# Altium integrated library LEMO Unipole And Multipole Type Connectors.IntLib: 1566 symbols (part 6 of 13)
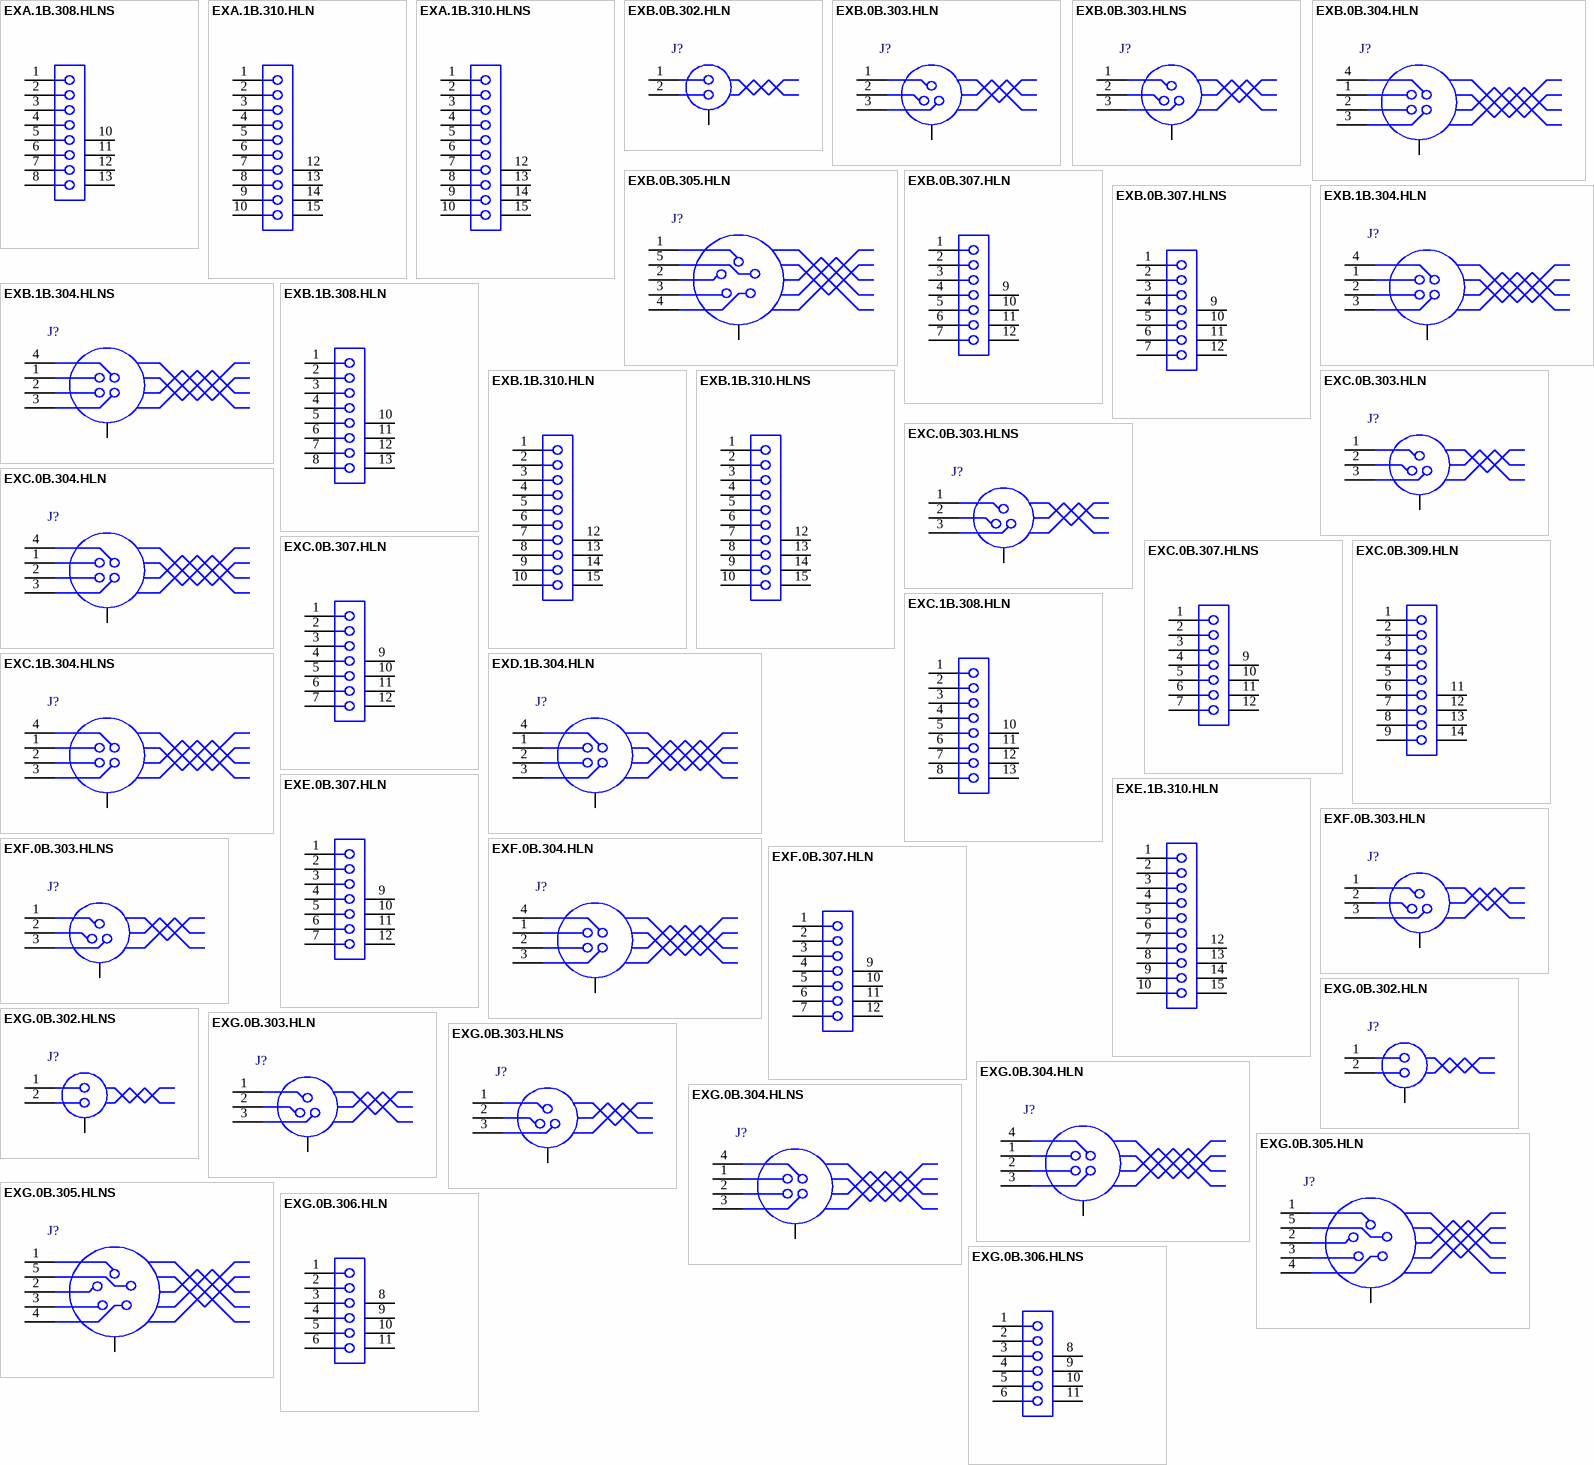
[diagram p48: symbols EXA.1B.308.HLNS to EXG.0B.306.HLNS]

## EXG.0B.304.HLN
designator J?
Elbow receptacle for printed circuit with two nuts (solder or screw fixing, back panel mounting), Key (G), 0B series, Multipole Type with 4 Contacts; Manufacturer: LEMO; PartNumber: EXG.0B.304.HLN; Number of contacts: 4; Contact Diameter: 0.7 mm; AWG: 24; Rated Current(A): 6; DatasheetVersion: Jun-14; PackageReference: EXG.0B.304.HLN; PackageDescription: Elbow receptacle for printed circuit with two nuts (solder or screw fixing, back panel mounting), Key(G) for Printed Circuit; Supplier 1: Mouser; Supplier Part Number 1: 736-EXG0B304HLN; Supplier 2: Newark; Supplier Part Number 2: 64R6458; Supplier 3: Digi-Key; Supplier Part Number 3: 1124-1428-ND; ComponentLink1Description: Manufacturer URL; ComponentLink1URL: http://www.lemo.com; ComponentLink2Description: Datasheet; ComponentLink2URL: http://intra.lemo.ch/catalog/ROW/UK_English/unipole_multipole.pdf
footprint EXG.0B.304.HLN (Socket, Female, Body 9mm dia. Height 10.5 mm, Through hole)
pins: 1, 2, 3, 4, 6, 7, 8, 9

## EXG.0B.304.HLNS
designator J?
Elbow receptacle for printed circuit with two nuts (solder or screw fixing, back panel mounting), Key (G), 0B series, Multipole Type with 4 Contacts; Manufacturer: LEMO; PartNumber: EXG.0B.304.HLNS; Number of contacts: 4; Contact Diameter: 0.7 mm; AWG: 24; Rated Current(A): 6; DatasheetVersion: Jun-14; PackageReference: EXG.0B.304.HLNS; PackageDescription: Elbow receptacle for printed circuit with two nuts (solder or screw fixing, back panel mounting), Key(G) for Printed Circuit; ComponentLink1Description: Manufacturer URL; ComponentLink1URL: http://www.lemo.com; ComponentLink2Description: Datasheet; ComponentLink2URL: http://intra.lemo.ch/catalog/ROW/UK_English/unipole_multipole.pdf
footprint EXG.0B.304.HLNS (Socket, Female, Body 9mm dia. Height 10.5 mm, Through hole)
pins: 1, 2, 3, 4, 6, 7, 8, 9

## EXG.0B.305.HLN
designator J?
Elbow receptacle for printed circuit with two nuts (solder or screw fixing, back panel mounting), Key (G), 0B series, Multipole Type with 5 Contacts; Manufacturer: LEMO; PartNumber: EXG.0B.305.HLN; Number of contacts: 5; Contact Diameter: 0.7 mm; AWG: 24; Rated Current(A): 6; DatasheetVersion: Jun-14; PackageReference: EXG.0B.305.HLN; PackageDescription: Elbow receptacle for printed circuit with two nuts (solder or screw fixing, back panel mounting), Key(G) for Printed Circuit; Supplier 1: Mouser; Supplier Part Number 1: 736-EXG0B305HLN; Supplier 2: Digi-Key; Supplier Part Number 2: EXG.0B.305.HLN-ND; ComponentLink1Description: Manufacturer URL; ComponentLink1URL: http://www.lemo.com; ComponentLink2Description: Datasheet; ComponentLink2URL: http://intra.lemo.ch/catalog/ROW/UK_English/unipole_multipole.pdf
footprint EXG.0B.305.HLN (Socket, Female, Body 9mm dia. Height 10.5 mm, Through hole)
pins: 1, 2, 3, 4, 5, 7, 8, 9, 10

## EXG.0B.305.HLNS
designator J?
Elbow receptacle for printed circuit with two nuts (solder or screw fixing, back panel mounting), Key (G), 0B series, Multipole Type with 5 Contacts; Manufacturer: LEMO; PartNumber: EXG.0B.305.HLNS; Number of contacts: 5; Contact Diameter: 0.7 mm; AWG: 24; Rated Current(A): 6; DatasheetVersion: Jun-14; PackageReference: EXG.0B.305.HLNS; PackageDescription: Elbow receptacle for printed circuit with two nuts (solder or screw fixing, back panel mounting), Key(G) for Printed Circuit; Supplier 1: Mouser; Supplier Part Number 1: 736-EXG0B305HLNS; Supplier 2: Digi-Key; Supplier Part Number 2: EXG.0B.305.HLNS-ND; ComponentLink1Description: Manufacturer URL; ComponentLink1URL: http://www.lemo.com; ComponentLink2Description: Datasheet; ComponentLink2URL: http://intra.lemo.ch/catalog/ROW/UK_English/unipole_multipole.pdf
footprint EXG.0B.305.HLNS (Socket, Female, Body 9mm dia. Height 10.5 mm, Through hole)
pins: 1, 2, 3, 4, 5, 7, 8, 9, 10

## EXG.0B.306.HLN
designator J?
Elbow receptacle for printed circuit with two nuts (solder or screw fixing, back panel mounting), Key (G), 0B series, Multipole Type with 6 Contacts; Manufacturer: LEMO; PartNumber: EXG.0B.306.HLN; Number of contacts: 6; Contact Diameter: 0.5 mm; AWG: 28; Rated Current(A): 2.5.; DatasheetVersion: Jun-14; PackageReference: EXG.0B.306.HLN; PackageDescription: Elbow receptacle for printed circuit with two nuts (solder or screw fixing, back panel mounting), Key(G) for Printed Circuit; Supplier 1: Mouser; Supplier Part Number 1: 736-EXG0B306HLN; Supplier 2: Newark; Supplier Part Number 2: 56W4223; Supplier 3: Digi-Key; Supplier Part Number 3: EXG.0B.306.HLN-ND; ComponentLink1Description: Manufacturer URL; ComponentLink1URL: http://www.lemo.com; ComponentLink2Description: Datasheet; ComponentLink2URL: http://intra.lemo.ch/catalog/ROW/UK_English/unipole_multipole.pdf
footprint EXG.0B.306.HLN (Socket, Female, Body 9mm dia. Height 10.5 mm, Through hole)
pins: 1, 2, 3, 4, 5, 6, 8, 9, 10, 11

## EXG.0B.306.HLNS
designator J?
Elbow receptacle for printed circuit with two nuts (solder or screw fixing, back panel mounting), Key (G), 0B series, Multipole Type with 6 Contacts; Manufacturer: LEMO; PartNumber: EXG.0B.306.HLNS; Number of contacts: 6; Contact Diameter: 0.5 mm; AWG: 28; Rated Current(A): 2.5.; DatasheetVersion: Jun-14; PackageReference: EXG.0B.306.HLNS; PackageDescription: Elbow receptacle for printed circuit with two nuts (solder or screw fixing, back panel mounting), Key(G) for Printed Circuit; ComponentLink1Description: Manufacturer URL; ComponentLink1URL: http://www.lemo.com; ComponentLink2Description: Datasheet; ComponentLink2URL: http://intra.lemo.ch/catalog/ROW/UK_English/unipole_multipole.pdf
footprint EXG.0B.306.HLNS (Socket, Female, Body 9mm dia. Height 10.5 mm, Through hole)
pins: 1, 2, 3, 4, 5, 6, 8, 9, 10, 11

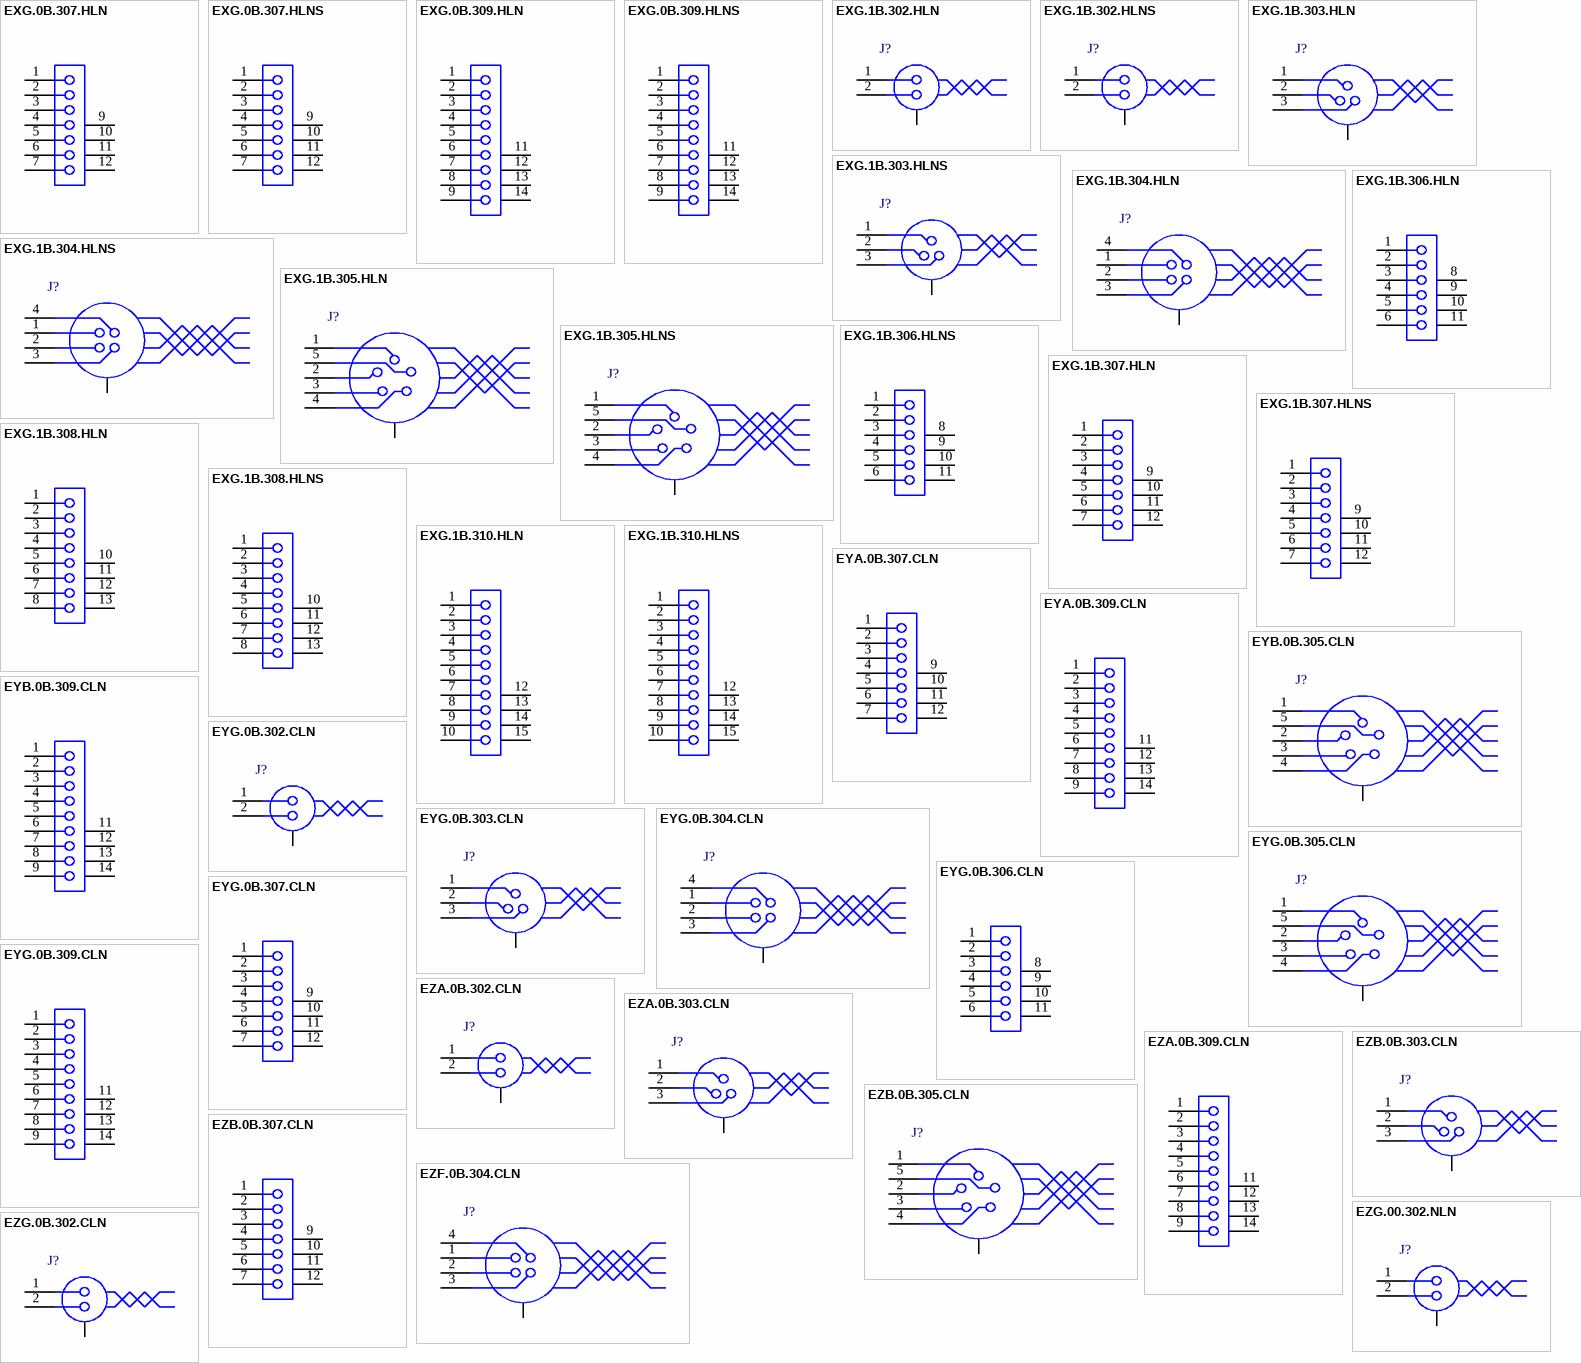
[diagram p17: symbols EXG.0B.307.HLN to EZG.0B.302.CLN]

## EXG.0B.307.HLN
designator J?
Elbow receptacle for printed circuit with two nuts (solder or screw fixing, back panel mounting), Key (G), 0B series, Multipole Type with 7 Contacts; Manufacturer: LEMO; PartNumber: EXG.0B.307.HLN; Number of contacts: 7; Contact Diameter: 0.5 mm; AWG: 28; Rated Current(A): 2; DatasheetVersion: Jun-14; PackageReference: EXG.0B.307.HLN; PackageDescription: Elbow receptacle for printed circuit with two nuts (solder or screw fixing, back panel mounting), Key(G) for Printed Circuit; Supplier 1: Mouser; Supplier Part Number 1: 736-EXG0B307HLN; Supplier 2: Newark; Supplier Part Number 2: 56W4221; ComponentLink1Description: Manufacturer URL; ComponentLink1URL: http://www.lemo.com; ComponentLink2Description: Datasheet; ComponentLink2URL: http://intra.lemo.ch/catalog/ROW/UK_English/unipole_multipole.pdf
footprint EXG.0B.307.HLN (Socket, Female, Body 9mm dia. Height 10.5 mm, Through hole)
pins: 1, 2, 3, 4, 5, 6, 7, 9, 10, 11, 12

## EXG.0B.307.HLNS
designator J?
Elbow receptacle for printed circuit with two nuts (solder or screw fixing, back panel mounting), Key (G), 0B series, Multipole Type with 7 Contacts; Manufacturer: LEMO; PartNumber: EXG.0B.307.HLNS; Number of contacts: 7; Contact Diameter: 0.5 mm; AWG: 28; Rated Current(A): 2; DatasheetVersion: Jun-14; PackageReference: EXG.0B.307.HLNS; PackageDescription: Elbow receptacle for printed circuit with two nuts (solder or screw fixing, back panel mounting), Key(G) for Printed Circuit; Supplier 1: Mouser; Supplier Part Number 1: 736-EXG0B307HLNS; Supplier 2: Digi-Key; Supplier Part Number 2: EXG.0B.307.HLNS-ND; ComponentLink1Description: Manufacturer URL; ComponentLink1URL: http://www.lemo.com; ComponentLink2Description: Datasheet; ComponentLink2URL: http://intra.lemo.ch/catalog/ROW/UK_English/unipole_multipole.pdf
footprint EXG.0B.307.HLNS (Socket, Female, Body 9mm dia. Height 10.5 mm, Through hole)
pins: 1, 2, 3, 4, 5, 6, 7, 9, 10, 11, 12

## EXG.0B.309.HLN
designator J?
Elbow receptacle for printed circuit with two nuts (solder or screw fixing, back panel mounting), Key (G), 0B series, Multipole Type with 9 Contacts; Manufacturer: LEMO; PartNumber: EXG.0B.309.HLN; Number of contacts: 9; Contact Diameter: 0.5 mm; AWG: 28; Rated Current(A): 1.5.; DatasheetVersion: Jun-14; PackageReference: EXG.0B.309.HLN; PackageDescription: Elbow receptacle for printed circuit with two nuts (solder or screw fixing, back panel mounting), Key(G) for Printed Circuit; Supplier 1: Mouser; Supplier Part Number 1: 736-EXG0B309HLN; Supplier 2: Newark; Supplier Part Number 2: 56W4225; Supplier 3: Digi-Key; Supplier Part Number 3: EXG.0B.309.HLN-ND; ComponentLink1Description: Manufacturer URL; ComponentLink1URL: http://www.lemo.com; ComponentLink2Description: Datasheet; ComponentLink2URL: http://intra.lemo.ch/catalog/ROW/UK_English/unipole_multipole.pdf
footprint EXG.0B.309.HLN (Socket, Female, Body 9mm dia. Height 10.5 mm, Through hole)
pins: 1, 2, 3, 4, 5, 6, 7, 8, 9, 11, 12, 13, 14

## EXG.0B.309.HLNS
designator J?
Elbow receptacle for printed circuit with two nuts (solder or screw fixing, back panel mounting), Key (G), 0B series, Multipole Type with 9 Contacts; Manufacturer: LEMO; PartNumber: EXG.0B.309.HLNS; Number of contacts: 9; Contact Diameter: 0.5 mm; AWG: 28; Rated Current(A): 1.5.; DatasheetVersion: Jun-14; PackageReference: EXG.0B.309.HLNS; PackageDescription: Elbow receptacle for printed circuit with two nuts (solder or screw fixing, back panel mounting), Key(G) for Printed Circuit; Supplier 1: Mouser; Supplier Part Number 1: 736-EXG0B309HLNS; Supplier 2: Digi-Key; Supplier Part Number 2: EXG.0B.309.HLNS-ND; ComponentLink1Description: Manufacturer URL; ComponentLink1URL: http://www.lemo.com; ComponentLink2Description: Datasheet; ComponentLink2URL: http://intra.lemo.ch/catalog/ROW/UK_English/unipole_multipole.pdf
footprint EXG.0B.309.HLNS (Socket, Female, Body 9mm dia. Height 10.5 mm, Through hole)
pins: 1, 2, 3, 4, 5, 6, 7, 8, 9, 11, 12, 13, 14

## EXG.1B.302.HLN
designator J?
Elbow receptacle for printed circuit with two nuts (solder or screw fixing, back panel mounting), Key (G), 1B series, Multipole Type with 2 Contacts; Manufacturer: LEMO; PartNumber: EXG.1B.302.HLN; Number of contacts: 2; Contact Diameter: 1.3 mm; AWG: 20; Rated Current(A): 12; DatasheetVersion: Jun-14; PackageReference: EXG.1B.302.HLN; PackageDescription: Elbow receptacle for printed circuit with two nuts (solder or screw fixing, back panel mounting), Key(G) for Printed Circuit; Supplier 1: Mouser; Supplier Part Number 1: 736-EXG1B302HLN; Supplier 2: Digi-Key; Supplier Part Number 2: EXG.1B.302.HLN-ND; ComponentLink1Description: Manufacturer URL; ComponentLink1URL: http://www.lemo.com; ComponentLink2Description: Datasheet; ComponentLink2URL: http://intra.lemo.ch/catalog/ROW/UK_English/unipole_multipole.pdf
footprint EXG.1B.302.HLN (Socket, Female, Body 11mm dia. Height 14 mm, Through hole)
pins: 1, 2, 4, 5, 6, 7

## EXG.1B.302.HLNS
designator J?
Elbow receptacle for printed circuit with two nuts (solder or screw fixing, back panel mounting), Key (G), 1B series, Multipole Type with 2 Contacts; Manufacturer: LEMO; PartNumber: EXG.1B.302.HLNS; Number of contacts: 2; Contact Diameter: 1.3 mm; AWG: 20; Rated Current(A): 12; DatasheetVersion: Jun-14; PackageReference: EXG.1B.302.HLNS; PackageDescription: Elbow receptacle for printed circuit with two nuts (solder or screw fixing, back panel mounting), Key(G) for Printed Circuit; ComponentLink1Description: Manufacturer URL; ComponentLink1URL: http://www.lemo.com; ComponentLink2Description: Datasheet; ComponentLink2URL: http://intra.lemo.ch/catalog/ROW/UK_English/unipole_multipole.pdf
footprint EXG.1B.302.HLNS (Socket, Female, Body 11mm dia. Height 14 mm, Through hole)
pins: 1, 2, 4, 5, 6, 7

## EXG.1B.303.HLN
designator J?
Elbow receptacle for printed circuit with two nuts (solder or screw fixing, back panel mounting), Key (G), 1B series, Multipole Type with 3 Contacts; Manufacturer: LEMO; PartNumber: EXG.1B.303.HLN; Number of contacts: 3; Contact Diameter: 1.3 mm; AWG: 20; Rated Current(A): 4.5.; DatasheetVersion: Jun-14; PackageReference: EXG.1B.303.HLN; PackageDescription: Elbow receptacle for printed circuit with two nuts (solder or screw fixing, back panel mounting), Key(G) for Printed Circuit; Supplier 1: Mouser; Supplier Part Number 1: 736-EXG1B303HLN; Supplier 2: Digi-Key; Supplier Part Number 2: EXG.1B.303.HLN-ND; ComponentLink1Description: Manufacturer URL; ComponentLink1URL: http://www.lemo.com; ComponentLink2Description: Datasheet; ComponentLink2URL: http://intra.lemo.ch/catalog/ROW/UK_English/unipole_multipole.pdf
footprint EXG.1B.303.HLN (Socket, Female, Body 11mm dia. Height 14 mm, Through hole)
pins: 1, 2, 3, 5, 6, 7, 8

## EXG.1B.303.HLNS
designator J?
Elbow receptacle for printed circuit with two nuts (solder or screw fixing, back panel mounting), Key (G), 1B series, Multipole Type with 3 Contacts; Manufacturer: LEMO; PartNumber: EXG.1B.303.HLNS; Number of contacts: 3; Contact Diameter: 1.3 mm; AWG: 20; Rated Current(A): 4.5.; DatasheetVersion: Jun-14; PackageReference: EXG.1B.303.HLNS; PackageDescription: Elbow receptacle for printed circuit with two nuts (solder or screw fixing, back panel mounting), Key(G) for Printed Circuit; Supplier 1: Mouser; Supplier Part Number 1: 736-EXG1B303HLNS; Supplier 2: Digi-Key; Supplier Part Number 2: EXG.1B.303.HLNS-ND; ComponentLink1Description: Manufacturer URL; ComponentLink1URL: http://www.lemo.com; ComponentLink2Description: Datasheet; ComponentLink2URL: http://intra.lemo.ch/catalog/ROW/UK_English/unipole_multipole.pdf
footprint EXG.1B.303.HLNS (Socket, Female, Body 11mm dia. Height 14 mm, Through hole)
pins: 1, 2, 3, 5, 6, 7, 8

## EXG.1B.304.HLN
designator J?
Elbow receptacle for printed circuit with two nuts (solder or screw fixing, back panel mounting), Key (G), 1B series, Multipole Type with 4 Contacts; Manufacturer: LEMO; PartNumber: EXG.1B.304.HLN; Number of contacts: 4; Contact Diameter: 0.9 mm; AWG: 22; Rated Current(A): 6; DatasheetVersion: Jun-14; PackageReference: EXG.1B.304.HLN; PackageDescription: Elbow receptacle for printed circuit with two nuts (solder or screw fixing, back panel mounting), Key(G) for Printed Circuit; Supplier 1: Mouser; Supplier Part Number 1: 736-EXG1B304HLN; Supplier 2: Newark; Supplier Part Number 2: 68R6350; Supplier 3: Digi-Key; Supplier Part Number 3: EXG.1B.304.HLN-ND; ComponentLink1Description: Manufacturer URL; ComponentLink1URL: http://www.lemo.com; ComponentLink2Description: Datasheet; ComponentLink2URL: http://intra.lemo.ch/catalog/ROW/UK_English/unipole_multipole.pdf
footprint EXG.1B.304.HLN (Socket, Female, Body 11mm dia. Height 14 mm, Through hole)
pins: 1, 2, 3, 4, 6, 7, 8, 9

## EXG.1B.304.HLNS
designator J?
Elbow receptacle for printed circuit with two nuts (solder or screw fixing, back panel mounting), Key (G), 1B series, Multipole Type with 4 Contacts; Manufacturer: LEMO; PartNumber: EXG.1B.304.HLNS; Number of contacts: 4; Contact Diameter: 0.9 mm; AWG: 22; Rated Current(A): 6; DatasheetVersion: Jun-14; PackageReference: EXG.1B.304.HLNS; PackageDescription: Elbow receptacle for printed circuit with two nuts (solder or screw fixing, back panel mounting), Key(G) for Printed Circuit; Supplier 1: Mouser; Supplier Part Number 1: 736-EXG1B304HLNS; Supplier 2: Digi-Key; Supplier Part Number 2: EXG.1B.304.HLNS-ND; ComponentLink1Description: Manufacturer URL; ComponentLink1URL: http://www.lemo.com; ComponentLink2Description: Datasheet; ComponentLink2URL: http://intra.lemo.ch/catalog/ROW/UK_English/unipole_multipole.pdf
footprint EXG.1B.304.HLNS (Socket, Female, Body 11mm dia. Height 14 mm, Through hole)
pins: 1, 2, 3, 4, 6, 7, 8, 9

## EXG.1B.305.HLN
designator J?
Elbow receptacle for printed circuit with two nuts (solder or screw fixing, back panel mounting), Key (G), 1B series, Multipole Type with 5 Contacts; Manufacturer: LEMO; PartNumber: EXG.1B.305.HLN; Number of contacts: 5; Contact Diameter: 0.9 mm; AWG: 22; Rated Current(A): 6; DatasheetVersion: Jun-14; PackageReference: EXG.1B.305.HLN; PackageDescription: Elbow receptacle for printed circuit with two nuts (solder or screw fixing, back panel mounting), Key(G) for Printed Circuit; Supplier 1: Mouser; Supplier Part Number 1: 736-EXG1B305HLN; Supplier 2: Newark; Supplier Part Number 2: 44W1638; Supplier 3: Digi-Key; Supplier Part Number 3: 1124-1371-ND; ComponentLink1Description: Manufacturer URL; ComponentLink1URL: http://www.lemo.com; ComponentLink2Description: Datasheet; ComponentLink2URL: http://intra.lemo.ch/catalog/ROW/UK_English/unipole_multipole.pdf
footprint EXG.1B.305.HLN (Socket, Female, Body 11mm dia. Height 14 mm, Through hole)
pins: 1, 2, 3, 4, 5, 7, 8, 9, 10

## EXG.1B.305.HLNS
designator J?
Elbow receptacle for printed circuit with two nuts (solder or screw fixing, back panel mounting), Key (G), 1B series, Multipole Type with 5 Contacts; Manufacturer: LEMO; PartNumber: EXG.1B.305.HLNS; Number of contacts: 5; Contact Diameter: 0.9 mm; AWG: 22; Rated Current(A): 6; DatasheetVersion: Jun-14; PackageReference: EXG.1B.305.HLNS; PackageDescription: Elbow receptacle for printed circuit with two nuts (solder or screw fixing, back panel mounting), Key(G) for Printed Circuit; Supplier 1: Mouser; Supplier Part Number 1: 736-EXG1B305HLNS; Supplier 2: Digi-Key; Supplier Part Number 2: EXG.1B.305.HLNS-ND; ComponentLink1Description: Manufacturer URL; ComponentLink1URL: http://www.lemo.com; ComponentLink2Description: Datasheet; ComponentLink2URL: http://intra.lemo.ch/catalog/ROW/UK_English/unipole_multipole.pdf
footprint EXG.1B.305.HLNS (Socket, Female, Body 11mm dia. Height 14 mm, Through hole)
pins: 1, 2, 3, 4, 5, 7, 8, 9, 10

## EXG.1B.306.HLN
designator J?
Elbow receptacle for printed circuit with two nuts (solder or screw fixing, back panel mounting), Key (G), 1B series, Multipole Type with 6 Contacts; Manufacturer: LEMO; PartNumber: EXG.1B.306.HLN; Number of contacts: 6; Contact Diameter: 0.7 mm; AWG: 24; DatasheetVersion: Jun-14; PackageReference: EXG.1B.306.HLN; PackageDescription: Elbow receptacle for printed circuit with two nuts (solder or screw fixing, back panel mounting), Key(G) for Printed Circuit; Supplier 1: Mouser; Supplier Part Number 1: 736-EXG1B306HLN; Supplier 2: Digi-Key; Supplier Part Number 2: 1124-1431-ND; Rated Current(A): 6; ComponentLink1Description: Manufacturer URL; ComponentLink1URL: http://www.lemo.com; ComponentLink2Description: Datasheet; ComponentLink2URL: http://intra.lemo.ch/catalog/ROW/UK_English/unipole_multipole.pdf
footprint EXG.1B.306.HLN (Socket, Female, Body 11mm dia. Height 14 mm, Through hole)
pins: 1, 2, 3, 4, 5, 6, 8, 9, 10, 11

## EXG.1B.306.HLNS
designator J?
Elbow receptacle for printed circuit with two nuts (solder or screw fixing, back panel mounting), Key (G), 1B series, Multipole Type with 6 Contacts; Manufacturer: LEMO; PartNumber: EXG.1B.306.HLNS; Number of contacts: 6; Contact Diameter: 0.7 mm; AWG: 24; DatasheetVersion: Jun-14; PackageReference: EXG.1B.306.HLNS; PackageDescription: Elbow receptacle for printed circuit with two nuts (solder or screw fixing, back panel mounting), Key(G) for Printed Circuit; Rated Current(A): 6; ComponentLink1Description: Manufacturer URL; ComponentLink1URL: http://www.lemo.com; ComponentLink2Description: Datasheet; ComponentLink2URL: http://intra.lemo.ch/catalog/ROW/UK_English/unipole_multipole.pdf
footprint EXG.1B.306.HLNS (Socket, Female, Body 11mm dia. Height 14 mm, Through hole)
pins: 1, 2, 3, 4, 5, 6, 8, 9, 10, 11

## EXG.1B.307.HLN
designator J?
Elbow receptacle for printed circuit with two nuts (solder or screw fixing, back panel mounting), Key (G), 1B series, Multipole Type with 7 Contacts; Manufacturer: LEMO; PartNumber: EXG.1B.307.HLN; Number of contacts: 7; Contact Diameter: 0.7 mm; AWG: 24; Rated Current(A): 6; DatasheetVersion: Jun-14; PackageReference: EXG.1B.307.HLN; PackageDescription: Elbow receptacle for printed circuit with two nuts (solder or screw fixing, back panel mounting), Key(G) for Printed Circuit; Supplier 1: Mouser; Supplier Part Number 1: 736-EXG1B307HLN; Supplier 2: Digi-Key; Supplier Part Number 2: 1124-1054-ND; ComponentLink1Description: Manufacturer URL; ComponentLink1URL: http://www.lemo.com; ComponentLink2Description: Datasheet; ComponentLink2URL: http://intra.lemo.ch/catalog/ROW/UK_English/unipole_multipole.pdf
footprint EXG.1B.307.HLN (Socket, Female, Body 11mm dia. Height 14 mm, Through hole)
pins: 1, 2, 3, 4, 5, 6, 7, 9, 10, 11, 12

## EXG.1B.307.HLNS
designator J?
Elbow receptacle for printed circuit with two nuts (solder or screw fixing, back panel mounting), Key (G), 1B series, Multipole Type with 7 Contacts; Manufacturer: LEMO; PartNumber: EXG.1B.307.HLNS; Number of contacts: 7; Contact Diameter: 0.7 mm; AWG: 24; Rated Current(A): 6; DatasheetVersion: Jun-14; PackageReference: EXG.1B.307.HLNS; PackageDescription: Elbow receptacle for printed circuit with two nuts (solder or screw fixing, back panel mounting), Key(G) for Printed Circuit; ComponentLink1Description: Manufacturer URL; ComponentLink1URL: http://www.lemo.com; ComponentLink2Description: Datasheet; ComponentLink2URL: http://intra.lemo.ch/catalog/ROW/UK_English/unipole_multipole.pdf
footprint EXG.1B.307.HLNS (Socket, Female, Body 11mm dia. Height 14 mm, Through hole)
pins: 1, 2, 3, 4, 5, 6, 7, 9, 10, 11, 12
